# Altium integrated library LEMO Unipole And Multipole Type Connectors.IntLib: 1566 symbols (part 8 of 13) (continued)
## PKA.M0.7SL.VZ (continued)
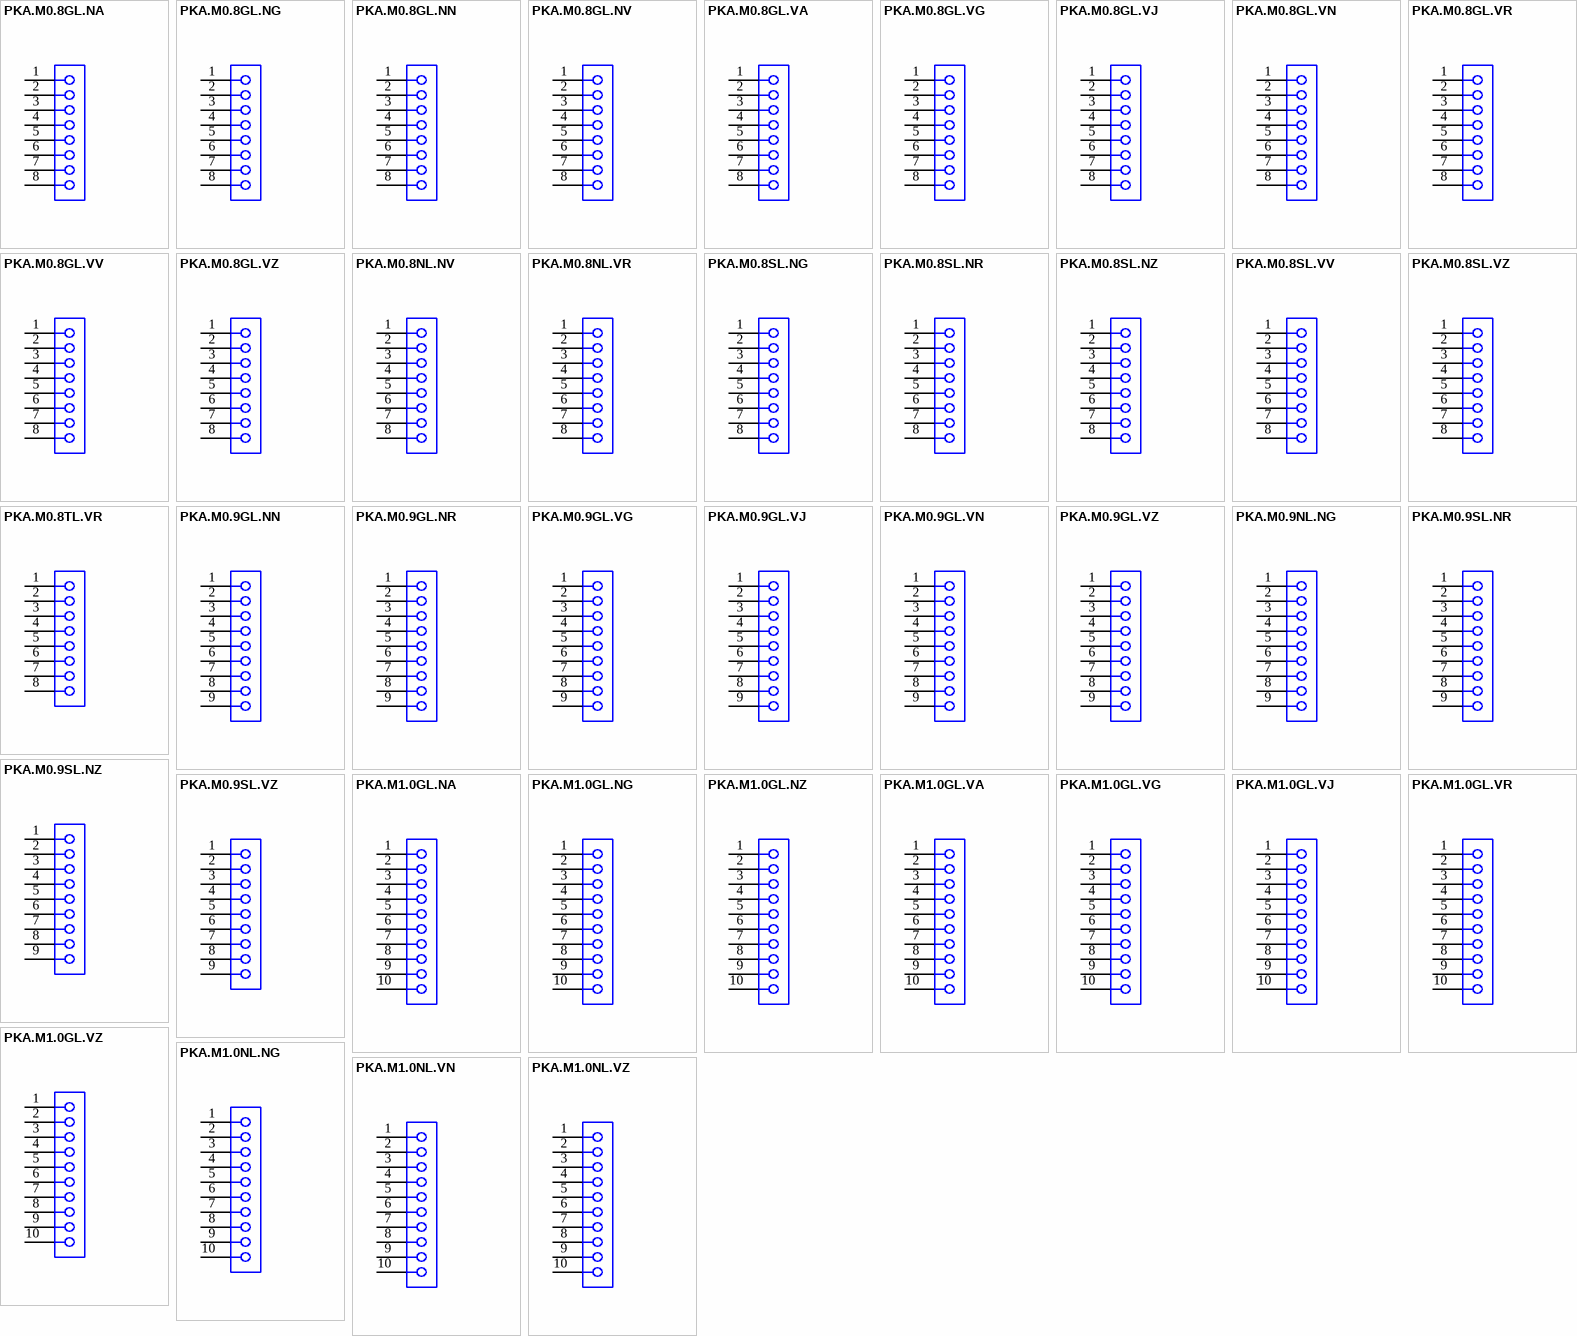
[diagram p26: symbols PKA.M0.8GL.NA to PKA.M1.0NL.VZ]

## PKA.M0.8GL.NA
designator J?
Fixed receptacle with two nuts (back panel mounting), straight print contacts, Key (A), P series, Multipole Type with 8 Contacts; Manufacturer: LEMO; PartNumber: PKA.M0.8GL.NA; Number of contacts: 8; Contact Diameter: 0.7 mm; Test voltage (kV rms) Contact-Contact: 1.05; Rated Current(A): 5; DatasheetVersion: Jun-14; PackageReference: PKA.M0.8GL.NA; PackageDescription: Fixed receptacle with two nuts (back panel mounting), straight print contacts, Key(A) for Printed Circuit; ComponentLink1Description: Manufacturer URL; ComponentLink1URL: http://www.lemo.com; ComponentLink2Description: Datasheet; ComponentLink2URL: http://intra.lemo.ch/catalog/ROW/UK_English/P_series_catalog.pdf
footprint PKA.M0.8GL.NA (Socket, Female, Height 33.5 mm, Through hole)
pins: 1, 2, 3, 4, 5, 6, 7, 8

## PKA.M0.8GL.NG
designator J?
Fixed receptacle with two nuts (back panel mounting), straight print contacts, Key (A), P series, Multipole Type with 8 Contacts; Manufacturer: LEMO; PartNumber: PKA.M0.8GL.NG; Number of contacts: 8; Contact Diameter: 0.7 mm; Test voltage (kV rms) Contact-Contact: 1.05; Rated Current(A): 5; DatasheetVersion: Jun-14; PackageReference: PKA.M0.8GL.NG; PackageDescription: Fixed receptacle with two nuts (back panel mounting), straight print contacts, Key(A) for Printed Circuit; ComponentLink1Description: Manufacturer URL; ComponentLink1URL: http://www.lemo.com; ComponentLink2Description: Datasheet; ComponentLink2URL: http://intra.lemo.ch/catalog/ROW/UK_English/P_series_catalog.pdf
footprint PKA.M0.8GL.NG (Socket, Female, Height 33.5 mm, Through hole)
pins: 1, 2, 3, 4, 5, 6, 7, 8

## PKA.M0.8GL.NN
designator J?
Fixed receptacle with two nuts (back panel mounting), straight print contacts, Key (A), P series, Multipole Type with 8 Contacts; Manufacturer: LEMO; PartNumber: PKA.M0.8GL.NN; Number of contacts: 8; Contact Diameter: 0.7 mm; Test voltage (kV rms) Contact-Contact: 1.05; Rated Current(A): 5; DatasheetVersion: Jun-14; PackageReference: PKA.M0.8GL.NN; PackageDescription: Fixed receptacle with two nuts (back panel mounting), straight print contacts, Key(A) for Printed Circuit; ComponentLink1Description: Manufacturer URL; ComponentLink1URL: http://www.lemo.com; ComponentLink2Description: Datasheet; ComponentLink2URL: http://intra.lemo.ch/catalog/ROW/UK_English/P_series_catalog.pdf
footprint PKA.M0.8GL.NN (Socket, Female, Height 33.5 mm, Through hole)
pins: 1, 2, 3, 4, 5, 6, 7, 8

## PKA.M0.8GL.NV
designator J?
Fixed receptacle with two nuts (back panel mounting), straight print contacts, Key (A), P series, Multipole Type with 8 Contacts; Manufacturer: LEMO; PartNumber: PKA.M0.8GL.NV; Number of contacts: 8; Contact Diameter: 0.7 mm; Test voltage (kV rms) Contact-Contact: 1.05; Rated Current(A): 5; DatasheetVersion: Jun-14; PackageReference: PKA.M0.8GL.NV; PackageDescription: Fixed receptacle with two nuts (back panel mounting), straight print contacts, Key(A) for Printed Circuit; ComponentLink1Description: Manufacturer URL; ComponentLink1URL: http://www.lemo.com; ComponentLink2Description: Datasheet; ComponentLink2URL: http://intra.lemo.ch/catalog/ROW/UK_English/P_series_catalog.pdf
footprint PKA.M0.8GL.NV (Socket, Female, Height 33.5 mm, Through hole)
pins: 1, 2, 3, 4, 5, 6, 7, 8

## PKA.M0.8GL.VA
designator J?
Fixed receptacle with two nuts (back panel mounting), 90° print contacts, Key (A), P series, Multipole Type with 8 Contacts; Manufacturer: LEMO; PartNumber: PKA.M0.8GL.VA; Number of contacts: 8; Contact Diameter: 0.7 mm; Test voltage (kV rms) Contact-Contact: 1.05; Rated Current(A): 5; DatasheetVersion: Jun-14; PackageReference: PKA.M0.8GL.VA; PackageDescription: Fixed receptacle with two nuts (back panel mounting), 90° print contacts, Key(A) for Printed Circuit; ComponentLink1Description: Manufacturer URL; ComponentLink1URL: http://www.lemo.com; ComponentLink2Description: Datasheet; ComponentLink2URL: http://intra.lemo.ch/catalog/ROW/UK_English/P_series_catalog.pdf
footprint PKA.M0.8GL.VA (Socket, Female, Height 33.5 mm, Through hole)
pins: 1, 2, 3, 4, 5, 6, 7, 8

## PKA.M0.8GL.VG
designator J?
Fixed receptacle with two nuts (back panel mounting), 90° print contacts, Key (A), P series, Multipole Type with 8 Contacts; Manufacturer: LEMO; PartNumber: PKA.M0.8GL.VG; Number of contacts: 8; Contact Diameter: 0.7 mm; Test voltage (kV rms) Contact-Contact: 1.05; Rated Current(A): 5; DatasheetVersion: Jun-14; PackageReference: PKA.M0.8GL.VG; PackageDescription: Fixed receptacle with two nuts (back panel mounting), 90° print contacts, Key(A) for Printed Circuit; ComponentLink1Description: Manufacturer URL; ComponentLink1URL: http://www.lemo.com; ComponentLink2Description: Datasheet; ComponentLink2URL: http://intra.lemo.ch/catalog/ROW/UK_English/P_series_catalog.pdf
footprint PKA.M0.8GL.VG (Socket, Female, Height 33.5 mm, Through hole)
pins: 1, 2, 3, 4, 5, 6, 7, 8

## PKA.M0.8GL.VJ
designator J?
Fixed receptacle with two nuts (back panel mounting), 90° print contacts, Key (A), P series, Multipole Type with 8 Contacts; Manufacturer: LEMO; PartNumber: PKA.M0.8GL.VJ; Number of contacts: 8; Contact Diameter: 0.7 mm; Test voltage (kV rms) Contact-Contact: 1.05; Rated Current(A): 5; DatasheetVersion: Jun-14; PackageReference: PKA.M0.8GL.VJ; PackageDescription: Fixed receptacle with two nuts (back panel mounting), 90° print contacts, Key(A) for Printed Circuit; ComponentLink1Description: Manufacturer URL; ComponentLink1URL: http://www.lemo.com; ComponentLink2Description: Datasheet; ComponentLink2URL: http://intra.lemo.ch/catalog/ROW/UK_English/P_series_catalog.pdf
footprint PKA.M0.8GL.VJ (Socket, Female, Through hole)
pins: 1, 2, 3, 4, 5, 6, 7, 8

## PKA.M0.8GL.VN
designator J?
Fixed receptacle with two nuts (back panel mounting), 90° print contacts, Key (A), P series, Multipole Type with 8 Contacts; Manufacturer: LEMO; PartNumber: PKA.M0.8GL.VN; Number of contacts: 8; Contact Diameter: 0.7 mm; Test voltage (kV rms) Contact-Contact: 1.05; Rated Current(A): 5; DatasheetVersion: Jun-14; PackageReference: PKA.M0.8GL.VN; PackageDescription: Fixed receptacle with two nuts (back panel mounting), 90° print contacts, Key(A) for Printed Circuit; ComponentLink1Description: Manufacturer URL; ComponentLink1URL: http://www.lemo.com; ComponentLink2Description: Datasheet; ComponentLink2URL: http://intra.lemo.ch/catalog/ROW/UK_English/P_series_catalog.pdf
footprint PKA.M0.8GL.VN (Socket, Female, Height 33.5 mm, Through hole)
pins: 1, 2, 3, 4, 5, 6, 7, 8

## PKA.M0.8GL.VR
designator J?
Fixed receptacle with two nuts (back panel mounting), 90° print contacts, Key (A), P series, Multipole Type with 8 Contacts; Manufacturer: LEMO; PartNumber: PKA.M0.8GL.VR; Number of contacts: 8; Contact Diameter: 0.7 mm; Test voltage (kV rms) Contact-Contact: 1.05; Rated Current(A): 5; DatasheetVersion: Jun-14; PackageReference: PKA.M0.8GL.VR; PackageDescription: Fixed receptacle with two nuts (back panel mounting), 90° print contacts, Key(A) for Printed Circuit; ComponentLink1Description: Manufacturer URL; ComponentLink1URL: http://www.lemo.com; ComponentLink2Description: Datasheet; ComponentLink2URL: http://intra.lemo.ch/catalog/ROW/UK_English/P_series_catalog.pdf
footprint PKA.M0.8GL.VR (Socket, Female, Height 33.5 mm, Through hole)
pins: 1, 2, 3, 4, 5, 6, 7, 8

## PKA.M0.8GL.VV
designator J?
Fixed receptacle with two nuts (back panel mounting), 90° print contacts, Key (A), P series, Multipole Type with 8 Contacts; Manufacturer: LEMO; PartNumber: PKA.M0.8GL.VV; Number of contacts: 8; Contact Diameter: 0.7 mm; Test voltage (kV rms) Contact-Contact: 1.05; Rated Current(A): 5; DatasheetVersion: Jun-14; PackageReference: PKA.M0.8GL.VV; PackageDescription: Fixed receptacle with two nuts (back panel mounting), 90° print contacts, Key(A) for Printed Circuit; ComponentLink1Description: Manufacturer URL; ComponentLink1URL: http://www.lemo.com; ComponentLink2Description: Datasheet; ComponentLink2URL: http://intra.lemo.ch/catalog/ROW/UK_English/P_series_catalog.pdf
footprint PKA.M0.8GL.VV (Socket, Female, Height 33.5 mm, Through hole)
pins: 1, 2, 3, 4, 5, 6, 7, 8

## PKA.M0.8GL.VZ
designator J?
Fixed receptacle with 1 nut (without 2nd front nut), Key (A), P series, Multipole Type with 8 Contacts; Manufacturer: LEMO; PartNumber: PKA.M0.8GL.VZ; Number of contacts: 8; Contact Diameter: 0.7 mm; Test voltage (kV rms) Contact-Contact: 1.05; Rated Current(A): 5; DatasheetVersion: Jun-14; PackageReference: PKA.M0.8GL.VZ; PackageDescription: Fixed receptacle with 1 nut (without 2nd front nut), Key(A) for Printed Circuit; ComponentLink1Description: Manufacturer URL; ComponentLink1URL: http://www.lemo.com; ComponentLink2Description: Datasheet; ComponentLink2URL: http://intra.lemo.ch/catalog/ROW/UK_English/P_series_catalog.pdf
footprint PKA.M0.8GL.VZ (Socket, Female, Height 33.5 mm, Through hole)
pins: 1, 2, 3, 4, 5, 6, 7, 8

## PKA.M0.8NL.NV
designator J?
Fixed receptacle with two nuts (back panel mounting), straight print contacts, Key (A), P series, Multipole Type with 8 Contacts; Manufacturer: LEMO; PartNumber: PKA.M0.8NL.NV; Number of contacts: 8; Contact Diameter: 0.7 mm; Test voltage (kV rms) Contact-Contact: 1.05; Rated Current(A): 5; DatasheetVersion: Jun-14; PackageReference: PKA.M0.8NL.NV; PackageDescription: Fixed receptacle with two nuts (back panel mounting), straight print contacts, Key(A) for Printed Circuit; ComponentLink1Description: Manufacturer URL; ComponentLink1URL: http://www.lemo.com; ComponentLink2Description: Datasheet; ComponentLink2URL: http://intra.lemo.ch/catalog/ROW/UK_English/P_series_catalog.pdf
footprint PKA.M0.8NL.NV (Socket, Female, Height 33.5 mm, Through hole)
pins: 1, 2, 3, 4, 5, 6, 7, 8

## PKA.M0.8NL.VR
designator J?
Fixed receptacle with two nuts (back panel mounting), 90° print contacts, Key (A), P series, Multipole Type with 8 Contacts; Manufacturer: LEMO; PartNumber: PKA.M0.8NL.VR; Number of contacts: 8; Contact Diameter: 0.7 mm; Test voltage (kV rms) Contact-Contact: 1.05; Rated Current(A): 5; DatasheetVersion: Jun-14; PackageReference: PKA.M0.8NL.VR; PackageDescription: Fixed receptacle with two nuts (back panel mounting), 90° print contacts, Key(A) for Printed Circuit; ComponentLink1Description: Manufacturer URL; ComponentLink1URL: http://www.lemo.com; ComponentLink2Description: Datasheet; ComponentLink2URL: http://intra.lemo.ch/catalog/ROW/UK_English/P_series_catalog.pdf
footprint PKA.M0.8NL.VR (Socket, Female, Height 33.5 mm, Through hole)
pins: 1, 2, 3, 4, 5, 6, 7, 8

## PKA.M0.8SL.NG
designator J?
Fixed receptacle with two nuts (back panel mounting), straight print contacts, Key (A),  series, Multipole Type with 8 Contacts; Manufacturer: LEMO; PartNumber: PKA.M0.8SL.NG; Number of contacts: 8; Contact Diameter: 0.7 mm; Test voltage (kV rms) Contact-Contact: 1.05; Rated Current(A): 5; DatasheetVersion: Jun-14; PackageReference: PKA.M0.8SL.NG; PackageDescription: Fixed receptacle with two nuts (back panel mounting), straight print contacts, Key(A) for Printed Circuit; Supplier 1: Mouser; Supplier Part Number 1: 736-PKAM08SLNG; Supplier 2: Digi-Key; Supplier Part Number 2: PKA.M0.8SL.NG-ND; ComponentLink1Description: Manufacturer URL; ComponentLink1URL: http://www.lemo.com; ComponentLink2Description: Datasheet; ComponentLink2URL: http://intra.lemo.ch/catalog/ROW/UK_English/P_series_catalog.pdf
footprint PKA.M0.8SL.NG (Socket, Female, Height 33.5 mm, Through hole)
pins: 1, 2, 3, 4, 5, 6, 7, 8

## PKA.M0.8SL.NR
designator J?
Fixed receptacle with two nuts (back panel mounting), straight print contacts, Key (A), P series, Multipole Type with 8 Contacts; Manufacturer: LEMO; PartNumber: PKA.M0.8SL.NR; Number of contacts: 8; Contact Diameter: 0.7 mm; Test voltage (kV rms) Contact-Contact: 1.05; Rated Current(A): 5; DatasheetVersion: Jun-14; PackageReference: PKA.M0.8SL.NR; PackageDescription: Fixed receptacle with two nuts (back panel mounting), straight print contacts, Key(A) for Printed Circuit; ComponentLink1Description: Manufacturer URL; ComponentLink1URL: http://www.lemo.com; ComponentLink2Description: Datasheet; ComponentLink2URL: http://intra.lemo.ch/catalog/ROW/UK_English/P_series_catalog.pdf
footprint PKA.M0.8SL.NR (Socket, Female, Height 33.5 mm, Through hole)
pins: 1, 2, 3, 4, 5, 6, 7, 8

## PKA.M0.8SL.NZ
designator J?
Fixed receptacle with 1 nut (without 2nd front nut), Key (A), P series, Multipole Type with 8 Contacts; Manufacturer: LEMO; PartNumber: PKA.M0.8SL.NZ; Number of contacts: 8; Contact Diameter: 0.7 mm; Test voltage (kV rms) Contact-Contact: 1.05; Rated Current(A): 5; DatasheetVersion: Jun-14; PackageReference: PKA.M0.8SL.NZ; PackageDescription: Fixed receptacle with 1 nut (without 2nd front nut), Key(A) for Printed Circuit; Supplier 1: Mouser; Supplier Part Number 1: 736-PKAM08SLNZ; Supplier 2: Digi-Key; Supplier Part Number 2: PKA.M0.8SL.NZ-ND; ComponentLink1Description: Manufacturer URL; ComponentLink1URL: http://www.lemo.com; ComponentLink2Description: Datasheet; ComponentLink2URL: http://intra.lemo.ch/catalog/ROW/UK_English/P_series_catalog.pdf
footprint PKA.M0.8SL.NZ (Socket, Female, Height 25 mm, Through hole)
pins: 1, 2, 3, 4, 5, 6, 7, 8

## PKA.M0.8SL.VV
designator J?
Fixed receptacle with two nuts (back panel mounting), 90° print contacts, Key (A), P series, Multipole Type with 8 Contacts; Manufacturer: LEMO; PartNumber: PKA.M0.8SL.VV; Number of contacts: 8; Contact Diameter: 0.7 mm; Test voltage (kV rms) Contact-Contact: 1.05; Rated Current(A): 5; DatasheetVersion: Jun-14; PackageReference: PKA.M0.8SL.VV; PackageDescription: Fixed receptacle with two nuts (back panel mounting), 90° print contacts, Key(A) for Printed Circuit; Supplier 1: Mouser; Supplier Part Number 1: 736-PKAM08SLVV; Supplier 2: Digi-Key; Supplier Part Number 2: PKA.M0.8SL.VV-ND; ComponentLink1Description: Manufacturer URL; ComponentLink1URL: http://www.lemo.com; ComponentLink2Description: Datasheet; ComponentLink2URL: http://intra.lemo.ch/catalog/ROW/UK_English/P_series_catalog.pdf
footprint PKA.M0.8SL.VV (Socket, Female, Height 33.5 mm, Through hole)
pins: 1, 2, 3, 4, 5, 6, 7, 8

## PKA.M0.8SL.VZ
designator J?
Fixed receptacle with 1 nut (without 2nd front nut), Key (A), P series, Multipole Type with 8 Contacts; Manufacturer: LEMO; PartNumber: PKA.M0.8SL.VZ; Number of contacts: 8; Contact Diameter: 0.7 mm; Test voltage (kV rms) Contact-Contact: 1.05; Rated Current(A): 5; DatasheetVersion: Jun-14; PackageReference: PKA.M0.8SL.VZ; PackageDescription: Fixed receptacle with 1 nut (without 2nd front nut), Key(A) for Printed Circuit; Supplier 1: Mouser; Supplier Part Number 1: 736-PKAM08SLVZ; Supplier 2: Digi-Key; Supplier Part Number 2: PKA.M0.8SL.VZ-ND; ComponentLink1Description: Manufacturer URL; ComponentLink1URL: http://www.lemo.com; ComponentLink2Description: Datasheet; ComponentLink2URL: http://intra.lemo.ch/catalog/ROW/UK_English/P_series_catalog.pdf
footprint PKA.M0.8SL.VZ (Socket, Female, Height 33.5 mm, Through hole)
pins: 1, 2, 3, 4, 5, 6, 7, 8

## PKA.M0.8TL.VR
designator J?
Fixed receptacle with two nuts (back panel mounting), 90° print contacts, Key (A), P series, Multipole Type with 8 Contacts; Manufacturer: LEMO; PartNumber: PKA.M0.8TL.VR; Number of contacts: 8; Contact Diameter: 0.7 mm; Test voltage (kV rms) Contact-Contact: 1.05; Rated Current(A): 5; DatasheetVersion: Jun-14; PackageReference: PKA.M0.8TL.VR; PackageDescription: Fixed receptacle with two nuts (back panel mounting), 90° print contacts, Key(A) for Printed Circuit; Supplier 1: Mouser; Supplier Part Number 1: 736-PKAM08TLVR; Supplier 2: Digi-Key; Supplier Part Number 2: PKA.M0.8TL.VR-ND; ComponentLink1Description: Manufacturer URL; ComponentLink1URL: http://www.lemo.com; ComponentLink2Description: Datasheet; ComponentLink2URL: http://intra.lemo.ch/catalog/ROW/UK_English/P_series_catalog.pdf
footprint PKA.M0.8TL.VR (Socket, Female, Height 33.5 mm, Through hole)
pins: 1, 2, 3, 4, 5, 6, 7, 8

## PKA.M0.9GL.NN
designator J?
Fixed receptacle with two nuts (back panel mounting), straight print contacts, Key (A), P series, Multipole Type with 9 Contacts; Manufacturer: LEMO; PartNumber: PKA.M0.9GL.NN; Number of contacts: 9; Contact Diameter: 0.5 mm; Test voltage (kV rms) Contact-Contact: 0.85; Rated Current(A): 3; DatasheetVersion: Jun-14; PackageReference: PKA.M0.9GL.NN; PackageDescription: Fixed receptacle with two nuts (back panel mounting), straight print contacts, Key(A) for Printed Circuit; ComponentLink1Description: Manufacturer URL; ComponentLink1URL: http://www.lemo.com; ComponentLink2Description: Datasheet; ComponentLink2URL: http://intra.lemo.ch/catalog/ROW/UK_English/P_series_catalog.pdf
footprint PKA.M0.9GL.NN (Socket, Female, Height 33.5 mm, Through hole)
pins: 1, 2, 3, 4, 5, 6, 7, 8, 9

## PKA.M0.9GL.NR
designator J?
Fixed receptacle with two nuts (back panel mounting), straight print contacts, Key (A), P series, Multipole Type with 9 Contacts; Manufacturer: LEMO; PartNumber: PKA.M0.9GL.NR; Number of contacts: 9; Contact Diameter: 0.5 mm; Test voltage (kV rms) Contact-Contact: 0.85; Rated Current(A): 3; DatasheetVersion: Jun-14; PackageReference: PKA.M0.9GL.NR; PackageDescription: Fixed receptacle with two nuts (back panel mounting), straight print contacts, Key(A) for Printed Circuit; ComponentLink1Description: Manufacturer URL; ComponentLink1URL: http://www.lemo.com; ComponentLink2Description: Datasheet; ComponentLink2URL: http://intra.lemo.ch/catalog/ROW/UK_English/P_series_catalog.pdf
footprint PKA.M0.9GL.NR (Socket, Female, Height 33.5 mm, Through hole)
pins: 1, 2, 3, 4, 5, 6, 7, 8, 9

## PKA.M0.9GL.VG
designator J?
Fixed receptacle with two nuts (back panel mounting), 90° print contacts, Key (A), P series, Multipole Type with 9 Contacts; Manufacturer: LEMO; PartNumber: PKA.M0.9GL.VG; Number of contacts: 9; Contact Diameter: 0.5 mm; Test voltage (kV rms) Contact-Contact: 0.85; Rated Current(A): 3; DatasheetVersion: Jun-14; PackageReference: PKA.M0.9GL.VG; PackageDescription: Fixed receptacle with two nuts (back panel mounting), 90° print contacts, Key(A) for Printed Circuit; ComponentLink1Description: Manufacturer URL; ComponentLink1URL: http://www.lemo.com; ComponentLink2Description: Datasheet; ComponentLink2URL: http://intra.lemo.ch/catalog/ROW/UK_English/P_series_catalog.pdf
footprint PKA.M0.9GL.VG (Socket, Female, Height 33.5 mm, Through hole)
pins: 1, 2, 3, 4, 5, 6, 7, 8, 9

## PKA.M0.9GL.VJ
designator J?
Fixed receptacle with two nuts (back panel mounting), 90° print contacts, Key (A), P series, Multipole Type with 9 Contacts; Manufacturer: LEMO; PartNumber: PKA.M0.9GL.VJ; Number of contacts: 9; Contact Diameter: 0.5 mm; Test voltage (kV rms) Contact-Contact: 0.85; Rated Current(A): 3; DatasheetVersion: Jun-14; PackageReference: PKA.M0.9GL.VJ; PackageDescription: Fixed receptacle with two nuts (back panel mounting), 90° print contacts, Key(A) for Printed Circuit; ComponentLink1Description: Manufacturer URL; ComponentLink1URL: http://www.lemo.com; ComponentLink2Description: Datasheet; ComponentLink2URL: http://intra.lemo.ch/catalog/ROW/UK_English/P_series_catalog.pdf
footprint PKA.M0.9GL.VJ (Socket, Female, Height 33.5 mm, Through hole)
pins: 1, 2, 3, 4, 5, 6, 7, 8, 9

## PKA.M0.9GL.VN
designator J?
Fixed receptacle with two nuts (back panel mounting), 90° print contacts, Key (A),  series, Multipole Type with 9 Contacts; Manufacturer: LEMO; PartNumber: PKA.M0.9GL.VN; Number of contacts: 9; Contact Diameter: 0.5 mm; Test voltage (kV rms) Contact-Contact: 0.85; Rated Current(A): 3; DatasheetVersion: Jun-14; PackageReference: PKA.M0.9GL.VN; PackageDescription: Fixed receptacle with two nuts (back panel mounting), 90° print contacts, Key(A) for Printed Circuit; ComponentLink1Description: Manufacturer URL; ComponentLink1URL: http://www.lemo.com; ComponentLink2Description: Datasheet; ComponentLink2URL: http://intra.lemo.ch/catalog/ROW/UK_English/P_series_catalog.pdf
footprint PKA.M0.9GL.VN (Socket, Female, Height 33.5 mm, Through hole)
pins: 1, 2, 3, 4, 5, 6, 7, 8, 9

## PKA.M0.9GL.VZ
designator J?
Fixed receptacle with 1 nut (without 2nd front nut), Key (A), P series, Multipole Type with 9 Contacts; Manufacturer: LEMO; PartNumber: PKA.M0.9GL.VZ; Number of contacts: 9; Contact Diameter: 0.5 mm; Test voltage (kV rms) Contact-Contact: 0.85; Rated Current(A): 3; DatasheetVersion: Jun-14; PackageReference: PKA.M0.9GL.VZ; PackageDescription: Fixed receptacle with 1 nut (without 2nd front nut), Key(A) for Printed Circuit; ComponentLink1Description: Manufacturer URL; ComponentLink1URL: http://www.lemo.com; ComponentLink2Description: Datasheet; ComponentLink2URL: http://intra.lemo.ch/catalog/ROW/UK_English/P_series_catalog.pdf
footprint PKA.M0.9GL.VZ (Socket, Female, Height 33.5 mm, Through hole)
pins: 1, 2, 3, 4, 5, 6, 7, 8, 9

## PKA.M0.9NL.NG
designator J?
Fixed receptacle with two nuts (back panel mounting), straight print contacts, Key (A), P series, Multipole Type with 9 Contacts; Manufacturer: LEMO; PartNumber: PKA.M0.9NL.NG; Number of contacts: 9; Contact Diameter: 0.5 mm; Test voltage (kV rms) Contact-Contact: 0.85; Rated Current(A): 3; DatasheetVersion: Jun-14; PackageReference: PKA.M0.9NL.NG; PackageDescription: Fixed receptacle with two nuts (back panel mounting), straight print contacts, Key(A) for Printed Circuit; ComponentLink1Description: Manufacturer URL; ComponentLink1URL: http://www.lemo.com; ComponentLink2Description: Datasheet; ComponentLink2URL: http://intra.lemo.ch/catalog/ROW/UK_English/P_series_catalog.pdf
footprint PKA.M0.9NL.NG (Socket, Female, Height 33.5 mm, Through hole)
pins: 1, 2, 3, 4, 5, 6, 7, 8, 9

## PKA.M0.9SL.NR
designator J?
Fixed receptacle with two nuts (back panel mounting), straight print contacts, Key (A),  series, Multipole Type with 9 Contacts; Manufacturer: LEMO; PartNumber: PKA.M0.9SL.NR; Number of contacts: 9; Contact Diameter: 0.5 mm; Test voltage (kV rms) Contact-Contact: 0.85; Rated Current(A): 3; DatasheetVersion: Jun-14; PackageReference: PKA.M0.9SL.NR; PackageDescription: Fixed receptacle with two nuts (back panel mounting), straight print contacts, Key(A) for Printed Circuit; Supplier 1: Mouser; Supplier Part Number 1: 736-PKAM09SLNR; Supplier 2: Digi-Key; Supplier Part Number 2: PKA.M0.9SL.NR-ND; ComponentLink1Description: Manufacturer URL; ComponentLink1URL: http://www.lemo.com; ComponentLink2Description: Datasheet; ComponentLink2URL: http://intra.lemo.ch/catalog/ROW/UK_English/P_series_catalog.pdf
footprint PKA.M0.9SL.NR (Socket, Female, Height 33.5 mm, Through hole)
pins: 1, 2, 3, 4, 5, 6, 7, 8, 9

## PKA.M0.9SL.NZ
designator J?
Fixed receptacle with 1 nut (without 2nd front nut), Key (A), P series, Multipole Type with 9 Contacts; Manufacturer: LEMO; PartNumber: PKA.M0.9SL.NZ; Number of contacts: 9; Contact Diameter: 0.5 mm; Test voltage (kV rms) Contact-Contact: 0.85; Rated Current(A): 3; DatasheetVersion: Jun-14; PackageReference: PKA.M0.9SL.NZ; PackageDescription: Fixed receptacle with 1 nut (without 2nd front nut), Key(A) for Printed Circuit; Supplier 1: Mouser; Supplier Part Number 1: 736-PKAM09SLNZ; Supplier 2: Digi-Key; Supplier Part Number 2: PKA.M0.9SL.NZ-ND; ComponentLink1Description: Manufacturer URL; ComponentLink1URL: http://www.lemo.com; ComponentLink2Description: Datasheet; ComponentLink2URL: http://intra.lemo.ch/catalog/ROW/UK_English/P_series_catalog.pdf
footprint PKA.M0.9SL.NZ (Socket, Female, Height 25 mm, Through hole)
pins: 1, 2, 3, 4, 5, 6, 7, 8, 9

## PKA.M0.9SL.VZ
designator J?
Fixed receptacle with 1 nut (without 2nd front nut), Key (A), P series, Multipole Type with 9 Contacts; Manufacturer: LEMO; PartNumber: PKA.M0.9SL.VZ; Number of contacts: 9; Contact Diameter: 0.5 mm; Test voltage (kV rms) Contact-Contact: 0.85; Rated Current(A): 3; DatasheetVersion: Jun-14; PackageReference: PKA.M0.9SL.VZ; PackageDescription: Fixed receptacle with 1 nut (without 2nd front nut), Key(A) for Printed Circuit; Supplier 1: Mouser; Supplier Part Number 1: 736-PKAM09SLVZ; Supplier 2: Digi-Key; Supplier Part Number 2: PKA.M0.9SL.VZ-ND; ComponentLink1Description: Manufacturer URL; ComponentLink1URL: http://www.lemo.com; ComponentLink2Description: Datasheet; ComponentLink2URL: http://intra.lemo.ch/catalog/ROW/UK_English/P_series_catalog.pdf
footprint PKA.M0.9SL.VZ (Socket, Female, Height 33.5 mm, Through hole)
pins: 1, 2, 3, 4, 5, 6, 7, 8, 9

## PKA.M1.0GL.NA
designator J?
Fixed receptacle with two nuts (back panel mounting), straight print contacts, Key (A),  series, Multipole Type with 10 Contacts; Manufacturer: LEMO; PartNumber: PKA.M1.0GL.NA; Number of contacts: 10; Contact Diameter: 0.5 mm; Test voltage (kV rms) Contact-Contact: 0.85; Rated Current(A): 3; DatasheetVersion: Jun-14; PackageReference: PKA.M1.0GL.NA; PackageDescription: Fixed receptacle with two nuts (back panel mounting), straight print contacts, Key(A) for Printed Circuit; ComponentLink1Description: Manufacturer URL; ComponentLink1URL: http://www.lemo.com; ComponentLink2Description: Datasheet; ComponentLink2URL: http://intra.lemo.ch/catalog/ROW/UK_English/P_series_catalog.pdf
footprint PKA.M1.0GL.NA (Socket, Female, Height 33.5 mm, Through hole)
pins: 1, 2, 3, 4, 5, 6, 7, 8, 9, 10

## PKA.M1.0GL.NG
designator J?
Fixed receptacle with two nuts (back panel mounting), straight print contacts, Key (A), P series, Multipole Type with 10 Contacts; Manufacturer: LEMO; PartNumber: PKA.M1.0GL.NG; Number of contacts: 10; Contact Diameter: 0.5 mm; Test voltage (kV rms) Contact-Contact: 0.85; Rated Current(A): 3; DatasheetVersion: Jun-14; PackageReference: PKA.M1.0GL.NG; PackageDescription: Fixed receptacle with two nuts (back panel mounting), straight print contacts, Key(A) for Printed Circuit; ComponentLink1Description: Manufacturer URL; ComponentLink1URL: http://www.lemo.com; ComponentLink2Description: Datasheet; ComponentLink2URL: http://intra.lemo.ch/catalog/ROW/UK_English/P_series_catalog.pdf
footprint PKA.M1.0GL.NG (Socket, Female, Height 33.5 mm, Through hole)
pins: 1, 2, 3, 4, 5, 6, 7, 8, 9, 10

## PKA.M1.0GL.NZ
designator J?
Fixed receptacle with 1 nut (without 2nd front nut), Key (A), P series, Multipole Type with 10 Contacts; Manufacturer: LEMO; PartNumber: PKA.M1.0GL.NZ; Number of contacts: 10; Contact Diameter: 0.5 mm; Test voltage (kV rms) Contact-Contact: 0.85; Rated Current(A): 3; DatasheetVersion: Jun-14; PackageReference: PKA.M1.0GL.NZ; PackageDescription: Fixed receptacle with 1 nut (without 2nd front nut), Key(A) for Printed Circuit; ComponentLink1Description: Manufacturer URL; ComponentLink1URL: http://www.lemo.com; ComponentLink2Description: Datasheet; ComponentLink2URL: http://intra.lemo.ch/catalog/ROW/UK_English/P_series_catalog.pdf
footprint PKA.M1.0GL.NZ (Socket, Female, Height 25 mm, Through hole)
pins: 1, 2, 3, 4, 5, 6, 7, 8, 9, 10

## PKA.M1.0GL.VA
designator J?
Fixed receptacle with two nuts (back panel mounting), 90° print contacts, Key (A), P series, Multipole Type with 10 Contacts; Manufacturer: LEMO; PartNumber: PKA.M1.0GL.VA; Number of contacts: 10; Contact Diameter: 0.5 mm; Test voltage (kV rms) Contact-Contact: 0.85; Rated Current(A): 3; DatasheetVersion: Jun-14; PackageReference: PKA.M1.0GL.VA; PackageDescription: Fixed receptacle with two nuts (back panel mounting), 90° print contacts, Key(A) for Printed Circuit; ComponentLink1Description: Manufacturer URL; ComponentLink1URL: http://www.lemo.com; ComponentLink2Description: Datasheet; ComponentLink2URL: http://intra.lemo.ch/catalog/ROW/UK_English/P_series_catalog.pdf
footprint PKA.M1.0GL.VA (Socket, Female, Height 33.5 mm, Through hole)
pins: 1, 2, 3, 4, 5, 6, 7, 8, 9, 10
